# Altium footprint library Mi Libreria.PcbLib: 184 footprints (part 12 of 12)
Each footprint in its own frame and in the unit in brackets; x right, y up, seen from the top. Pads: shape width x height; smd on the part's side, far side on the other; paste and mask are expansions set on the pad; w line width, h text height; cw(c..) or ccw(c..) is an arc to the next point about the centre after c.
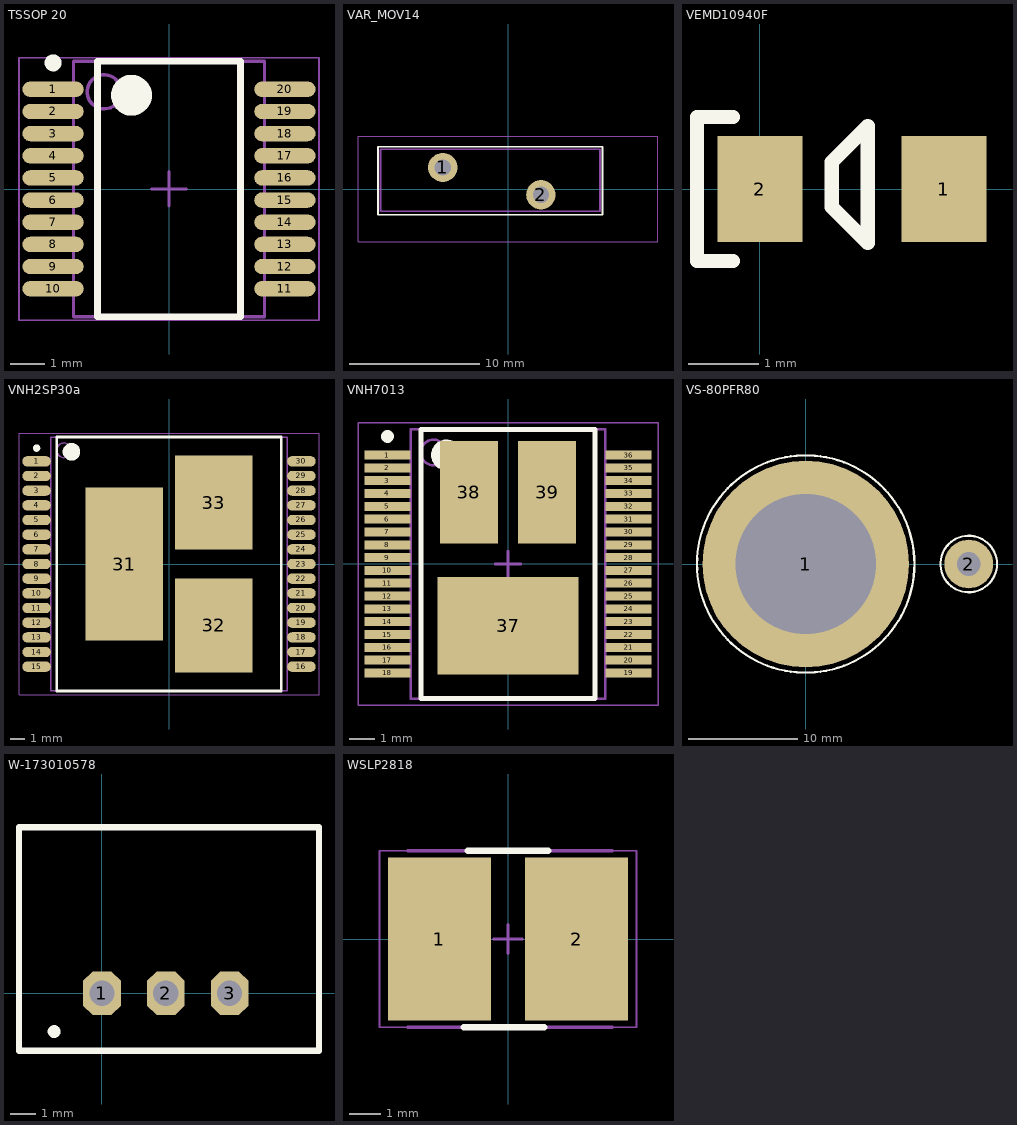
[diagram p11: the footprints below, top view; thin cyan lines are the x and y axes]

## TSSOP 20 [mm] "TSSOP 20 PIN"
pads (20):
  oval 1.8x0.45 smd: 1(-3.4,2.925) 2(-3.4,2.275) 3(-3.4,1.625) 4(-3.4,0.975) 5(-3.4,0.325) 6(-3.4,-0.325) 7(-3.4,-0.975) 8(-3.4,-1.625) 9(-3.4,-2.275) 10(-3.4,-2.925) 11(3.4,-2.925) 12(3.4,-2.275) 13(3.4,-1.625) 14(3.4,-0.975) 15(3.4,-0.325) 16(3.4,0.325) 17(3.4,0.975) 18(3.4,1.625) 19(3.4,2.275) 20(3.4,2.925)
Top Overlay:
  circle w0.6: c-1.1,2.75 r0.3
  circle w0.25: c-3.4,3.7 r0.125
  lines w0.2: -2.1,-3.75 2.1,-3.75 2.1,3.75 -2.1,3.75 -2.1,-3.75
Mechanical 13:
  circle w0.1: c-1.9,2.85 r0.5
  lines w0.1: -2.8,-3.75 2.8,-3.75 2.8,3.75 -2.8,3.75 -2.8,-3.75
Mechanical 15:
  lines w0.05: -4.4,-3.85 4.4,-3.85 4.4,3.85 -4.4,3.85 -4.4,-3.85
  lines w0.1: -0.5,0 0.5,0 ; 0,-0.5 0,0.5
3D body "TSSOP-20-2.STEP": height 1.2, standoff 0, extent -3.2,-3.25 3.2,3.25

## VAR_MOV14 [mm]
pads (2):
  round 2.25 hole 1.25: 1(-5,1.65) 2(2.524,-0.443)
Top Overlay:
  lines w0.127: -9.97,-1.968 -9.97,3.238 7.239,3.238 7.239,-1.968 -9.97,-1.968
Mechanical 13:
  lines w0.127: -9.779,-1.714 7.048,-1.714 7.048,3.048 -9.779,3.048 -9.779,-1.714
Mechanical 15:
  lines w0.05: -11.5,-4.05 11.5,-4.05 11.5,4.05 -11.5,4.05 -11.5,-4.05
3D body "MOV-14D391K.STEP": height 22, standoff -18, extent -9.647,-1.542 6.853,2.858

## VEMD10940F [mm] "IR Led SMD"
pads (2):
  rect 1.2x1.5 smd: 1(2.6,0) 2(0,0)
Top Overlay:
  lines w0.2: -0.381,-1.016 -0.889,-1.016 -0.889,1.016 -0.381,1.016 ; 1.016,-0.254 1.524,-0.762 1.524,0.889 1.016,0.381 1.016,-0.254
3D body: height 1.2, standoff 0.4, extent 0.254,-0.508 2.413,0.508
3D body: height 1.65, standoff 0.35, extent 0.69,-0.647 1.984,0.647
3D body: height 1, standoff 0.1, extent -0.127,-0.635 2.794,0.635

## VNH2SP30a [mm]
height 2.4
pads (33):
  oval 1.95x0.7 smd: 1(-9.025,7) 2(-9.025,6) 3(-9.025,5) 4(-9.025,4) 5(-9.025,3) 6(-9.025,2) 7(-9.025,1) 8(-9.025,0) 9(-9.025,-1) 10(-9.025,-2) 11(-9.025,-3) 12(-9.025,-4) 13(-9.025,-5) 14(-9.025,-6) 15(-9.025,-7) 16(9.025,-7) 17(9.025,-6) 18(9.025,-5) 19(9.025,-4) 20(9.025,-3) 21(9.025,-2) 22(9.025,-1) 23(9.025,0) 24(9.025,1) 25(9.025,2) 26(9.025,3) 27(9.025,4) 28(9.025,5) 29(9.025,6) 30(9.025,7)
  rect 5.3x10.4 smd: 31(-3.048,0)
  rect 5.3x6.4 smd: 32(3.048,-4.191) 33(3.048,4.191)
Top Overlay:
  circle w0.6: c-6.65,7.65 r0.3
  circle w0.25: c-9.025,7.9 r0.125
  lines w0.2: -7.65,-8.65 7.65,-8.65 7.65,8.65 -7.65,8.65 -7.65,-8.65
Mechanical 13:
  circle w0.1: c-7.15,7.75 r0.5
  lines w0.1: -8.05,-8.65 8.05,-8.65 8.05,8.65 -8.05,8.65 -8.05,-8.65
Mechanical 15:
  lines w0.05: -10.225,-8.9 10.225,-8.9 10.225,8.9 -10.225,8.9 -10.225,-8.9
3D body "VNH2SP30a.step": height 2.4, standoff 0, extent -9.55,-8.65 9.55,8.65

## VNH7013 [mm]
height 2.47
pads (39):
  rect 1.8x0.35 smd: 1(-4.7,4.25) 2(-4.7,3.75) 3(-4.7,3.25) 4(-4.7,2.75) 5(-4.7,2.25) 6(-4.7,1.75) 7(-4.7,1.25) 8(-4.7,0.75) 9(-4.7,0.25) 10(-4.7,-0.25) 11(-4.7,-0.75) 12(-4.7,-1.25) 13(-4.7,-1.75) 14(-4.7,-2.25) 15(-4.7,-2.75) 16(-4.7,-3.25) 17(-4.7,-3.75) 18(-4.7,-4.25) 19(4.7,-4.25) 20(4.7,-3.75) 21(4.7,-3.25) 22(4.7,-2.75) 23(4.7,-2.25) 24(4.7,-1.75) 25(4.7,-1.25) 26(4.7,-0.75) 27(4.7,-0.25) 28(4.7,0.25) 29(4.7,0.75) 30(4.7,1.25) 31(4.7,1.75) 32(4.7,2.25) 33(4.7,2.75) 34(4.7,3.25) 35(4.7,3.75) 36(4.7,4.25)
  rect 5.5x3.8 smd: 37(0,-2.413)
  rect 2.25x4 smd: 38(-1.524,2.794) 39(1.524,2.794)
Top Overlay:
  circle w0.6: c-2.4,4.25 r0.3
  circle w0.25: c-4.7,4.975 r0.125
  lines w0.2: -3.4,-5.25 3.4,-5.25 3.4,5.25 -3.4,5.25 -3.4,-5.25
Mechanical 13:
  circle w0.1: c-2.9,4.35 r0.5
  lines w0.1: -3.8,-5.25 3.8,-5.25 3.8,5.25 -3.8,5.25 -3.8,-5.25
Mechanical 15:
  lines w0.05: -5.85,-5.5 5.85,-5.5 5.85,5.5 -5.85,5.5 -5.85,-5.5
  lines w0.1: -0.5,0 0.5,0 ; 0,-0.5 0,0.5
3D body "Power SSO-36.step": height 2.45, standoff -0.09, extent -5.169,-5.15 5.169,5.15

## VS-80PFR80 [mm] "Power Diode VS-80PFR80"
pads (2):
  round 19 hole 12.9: 1(0,0)
  round 4.5 hole 2.2: 2(15,0)
Top Overlay:
  circle w0.2: c0,0 r10
  circle w0.2: c15,0 r2.6
3D body "10A10.step": height 9.1, standoff -2, extent -4.46,-4.4 15.72,4.4
3D body: height 10, standoff 0, extent -6,-6 6,6
3D body: height 1, standoff -3, extent -6,-6 6,6

## W-173010578 [mm] "Convertidor DC-DC"
pads (3):
  oct 1.5x1.75 hole 1: 1(0,0) 2(2.54,0) 3(5.08,0)
Top Overlay:
  circle w0.254: c-1.905,-1.524 r0.127
  lines w0.254: -3.302,-2.286 -3.302,6.604 8.636,6.604 8.636,-2.286 -3.302,-2.286
3D body "MAGIC-FDSM-SIP-3-rev1.STP": height 10.9, standoff -3.6, extent -3.133,-2.032 8.467,6.518

## WSLP2818 [mm] "10W Resistor Shunt SMD"
pads (2):
  rect 3.25x5.15 smd: 1(-2.17,0) 2(2.17,0)
Top Overlay:
  lines w0.2: -1.397,-2.794 1.143,-2.794 ; -1.27,2.794 1.27,2.794
Mechanical 13:
  lines w0.1: -3.175,-2.794 3.302,-2.794 ; -3.175,2.794 3.302,2.794
Mechanical 15:
  lines w0.05: -4.064,-2.794 -4.064,2.794 4.064,2.794 4.064,-2.794 -4.064,-2.794
  lines w0.1: -0.45,0 0.45,0 ; 0,-0.45 0,0.45
3D body "WSHP2818.stp": height 1.55, standoff 0.05, extent -3.55,-2.314 3.55,2.286